# Altium footprint library con-samtec.PCBLIB: 805 footprints (part 26 of 55)
Each footprint in its own frame and in the unit in brackets; x right, y up, seen from the top. Pads: shape width x height; smd on the part's side, far side on the other; paste and mask are expansions set on the pad; w line width, h text height; cw(c..) or ccw(c..) is an arc to the next point about the centre after c.
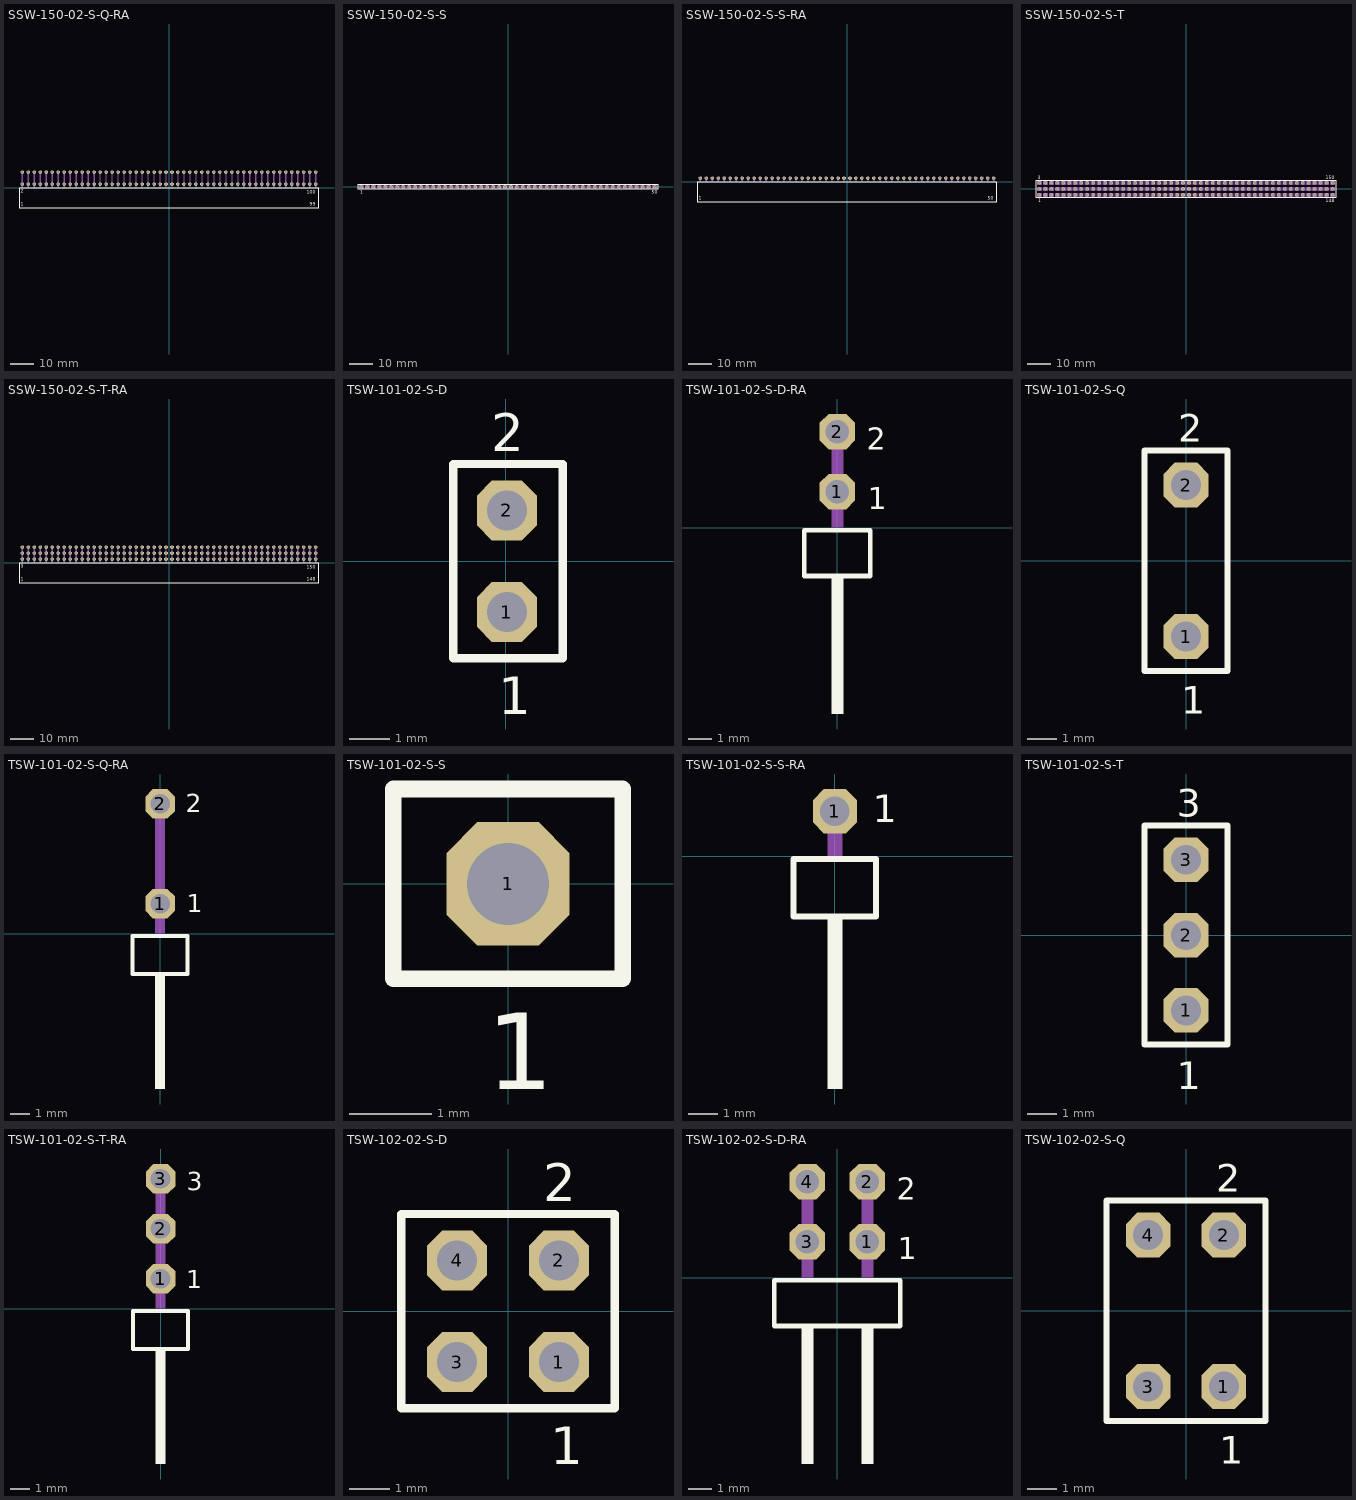
[diagram p25: the footprints below, top view; thin cyan lines are the x and y axes]

## SSW-150-02-S-Q-RA [mil]
pads (100):
  oct 59.06x59.06 hole 39.37: 1(-2450,60) 2(-2450,260) 3(-2350,60) 4(-2350,260) 5(-2250,60) 6(-2250,260) 7(-2150,60) 8(-2150,260) 9(-2050,60) 10(-2050,260) 11(-1950,60) 12(-1950,260) 13(-1850,60) 14(-1850,260) 15(-1750,60) 16(-1750,260) 17(-1650,60) 18(-1650,260) 19(-1550,60) 20(-1550,260) 21(-1450,60) 22(-1450,260) 23(-1350,60) 24(-1350,260) 25(-1250,60) 26(-1250,260) 27(-1150,60) 28(-1150,260) 29(-1050,60) 30(-1050,260) 31(-950,60) 32(-950,260) 33(-850,60) 34(-850,260) 35(-750,60) 36(-750,260) 37(-650,60) 38(-650,260) 39(-550,60) 40(-550,260) 41(-450,60) 42(-450,260) 43(-350,60) 44(-350,260) 45(-250,60) 46(-250,260) 47(-150,60) 48(-150,260) 49(-50,60) 50(-50,260) 51(50,60) 52(50,260) 53(150,60) 54(150,260) 55(250,60) 56(250,260) 57(350,60) 58(350,260) 59(450,60) 60(450,260) 61(550,60) 62(550,260) 63(650,60) 64(650,260) 65(750,60) 66(750,260) 67(850,60) 68(850,260) 69(950,60) 70(950,260) 71(1050,60) 72(1050,260) 73(1150,60) 74(1150,260) 75(1250,60) 76(1250,260) 77(1350,60) 78(1350,260) 79(1450,60) 80(1450,260) 81(1550,60) 82(1550,260) 83(1650,60) 84(1650,260) 85(1750,60) 86(1750,260) 87(1850,60) 88(1850,260) 89(1950,60) 90(1950,260) 91(2050,60) 92(2050,260) 93(2150,60) 94(2150,260) 95(2250,60) 96(2250,260) 97(2350,60) 98(2350,260) 99(2450,60) 100(2450,260)
Top Overlay:
  lines w8: -2505.08,-330.55 2505.08,-330.55 2505.08,-4.17 -2505.08,-4.17 -2505.08,-330.55
  text "1" at -2473.43,-301.18 h56.1
  text "100" at 2300,-100 h56.1
  text "99" at 2350,-300 h56.1
  text "2" at -2476.38,-86.61 h56.1
Mechanical 16:
  rectangle: -2460,0 -2440,270
  rectangle: -2360,0 -2340,270
  rectangle: -2260,0 -2240,270
  rectangle: -2160,0 -2140,270
  rectangle: -2060,0 -2040,270
  rectangle: -1960,0 -1940,270
  rectangle: -1860,0 -1840,270
  rectangle: -1760,0 -1740,270
  rectangle: -1660,0 -1640,270
  rectangle: -1560,0 -1540,270
  rectangle: -1460,0 -1440,270
  rectangle: -1360,0 -1340,270
  rectangle: -1260,0 -1240,270
  rectangle: -1160,0 -1140,270
  rectangle: -1060,0 -1040,270
  rectangle: -960,0 -940,270
  rectangle: -860,0 -840,270
  rectangle: -760,0 -740,270
  rectangle: -660,0 -640,270
  rectangle: -560,0 -540,270
  rectangle: -460,0 -440,270
  rectangle: -360,0 -340,270
  rectangle: -260,0 -240,270
  rectangle: -160,0 -140,270
  rectangle: -60,0 -40,270
  rectangle: 40,0 60,270
  rectangle: 140,0 160,270
  rectangle: 240,0 260,270
  rectangle: 340,0 360,270
  rectangle: 440,0 460,270
  rectangle: 540,0 560,270
  rectangle: 640,0 660,270
  rectangle: 740,0 760,270
  rectangle: 840,0 860,270
  rectangle: 940,0 960,270
  rectangle: 1040,0 1060,270
  rectangle: 1140,0 1160,270
  rectangle: 1240,0 1260,270
  rectangle: 1340,0 1360,270
  rectangle: 1440,0 1460,270
  rectangle: 1540,0 1560,270
  rectangle: 1640,0 1660,270
  rectangle: 1740,0 1760,270
  rectangle: 1840,0 1860,270
  rectangle: 1940,0 1960,270
  rectangle: 2040,0 2060,270
  rectangle: 2140,0 2160,270
  rectangle: 2240,0 2260,270
  rectangle: 2340,0 2360,270
  rectangle: 2440,0 2460,270

## SSW-150-02-S-S [mm]
pads (50):
  oct 1.5x1.5 hole 1: 1(-62.23,0) 2(-59.69,0) 3(-57.15,0) 4(-54.61,0) 5(-52.07,0) 6(-49.53,0) 7(-46.99,0) 8(-44.45,0) 9(-41.91,0) 10(-39.37,0) 11(-36.83,0) 12(-34.29,0) 13(-31.75,0) 14(-29.21,0) 15(-26.67,0) 16(-24.13,0) 17(-21.59,0) 18(-19.05,0) 19(-16.51,0) 20(-13.97,0) 21(-11.43,0) 22(-8.89,0) 23(-6.35,0) 24(-3.81,0) 25(-1.27,0) 26(1.27,0) 27(3.81,0) 28(6.35,0) 29(8.89,0) 30(11.43,0) 31(13.97,0) 32(16.51,0) 33(19.05,0) 34(21.59,0) 35(24.13,0) 36(26.67,0) 37(29.21,0) 38(31.75,0) 39(34.29,0) 40(36.83,0) 41(39.37,0) 42(41.91,0) 43(44.45,0) 44(46.99,0) 45(49.53,0) 46(52.07,0) 47(54.61,0) 48(57.15,0) 49(59.69,0) 50(62.23,0)
Top Overlay:
  lines w0.203: -63.629,-1.155 63.629,-1.155 63.629,1.155 -63.629,1.155 -63.629,-1.155
  text "1" at -62.738,-3.048 h1.42
  text "50" at 60.96,-3.048 h1.42
Mechanical 16:
  drawing of 200 lines, arcs and shapes, not listed

## SSW-150-02-S-S-RA [mil]
pads (50):
  oct 59.06x59.06 hole 39.37: 1(-2450,60) 2(-2350,60) 3(-2250,60) 4(-2150,60) 5(-2050,60) 6(-1950,60) 7(-1850,60) 8(-1750,60) 9(-1650,60) 10(-1550,60) 11(-1450,60) 12(-1350,60) 13(-1250,60) 14(-1150,60) 15(-1050,60) 16(-950,60) 17(-850,60) 18(-750,60) 19(-650,60) 20(-550,60) 21(-450,60) 22(-350,60) 23(-250,60) 24(-150,60) 25(-50,60) 26(50,60) 27(150,60) 28(250,60) 29(350,60) 30(450,60) 31(550,60) 32(650,60) 33(750,60) 34(850,60) 35(950,60) 36(1050,60) 37(1150,60) 38(1250,60) 39(1350,60) 40(1450,60) 41(1550,60) 42(1650,60) 43(1750,60) 44(1850,60) 45(1950,60) 46(2050,60) 47(2150,60) 48(2250,60) 49(2350,60) 50(2450,60)
Top Overlay:
  lines w8: -2505.08,-330.55 2505.08,-330.55 2505.08,-4.17 -2505.08,-4.17 -2505.08,-330.55
  text "1" at -2473.43,-301.18 h56.1
  text "50" at 2350,-300 h56.1
Mechanical 16:
  rectangle: -2460,0 -2440,70
  rectangle: -2360,0 -2340,70
  rectangle: -2260,0 -2240,70
  rectangle: -2160,0 -2140,70
  rectangle: -2060,0 -2040,70
  rectangle: -1960,0 -1940,70
  rectangle: -1860,0 -1840,70
  rectangle: -1760,0 -1740,70
  rectangle: -1660,0 -1640,70
  rectangle: -1560,0 -1540,70
  rectangle: -1460,0 -1440,70
  rectangle: -1360,0 -1340,70
  rectangle: -1260,0 -1240,70
  rectangle: -1160,0 -1140,70
  rectangle: -1060,0 -1040,70
  rectangle: -960,0 -940,70
  rectangle: -860,0 -840,70
  rectangle: -760,0 -740,70
  rectangle: -660,0 -640,70
  rectangle: -560,0 -540,70
  rectangle: -460,0 -440,70
  rectangle: -360,0 -340,70
  rectangle: -260,0 -240,70
  rectangle: -160,0 -140,70
  rectangle: -60,0 -40,70
  rectangle: 40,0 60,70
  rectangle: 140,0 160,70
  rectangle: 240,0 260,70
  rectangle: 340,0 360,70
  rectangle: 440,0 460,70
  rectangle: 540,0 560,70
  rectangle: 640,0 660,70
  rectangle: 740,0 760,70
  rectangle: 840,0 860,70
  rectangle: 940,0 960,70
  rectangle: 1040,0 1060,70
  rectangle: 1140,0 1160,70
  rectangle: 1240,0 1260,70
  rectangle: 1340,0 1360,70
  rectangle: 1440,0 1460,70
  rectangle: 1540,0 1560,70
  rectangle: 1640,0 1660,70
  rectangle: 1740,0 1760,70
  rectangle: 1840,0 1860,70
  rectangle: 1940,0 1960,70
  rectangle: 2040,0 2060,70
  rectangle: 2140,0 2160,70
  rectangle: 2240,0 2260,70
  rectangle: 2340,0 2360,70
  rectangle: 2440,0 2460,70

## SSW-150-02-S-T [mm]
pads (150):
  oct 1.5x1.5 hole 1: 1(-62.23,-2.54) 2(-62.23,0) 3(-62.23,2.54) 4(-59.69,-2.54) 5(-59.69,0) 6(-59.69,2.54) 7(-57.15,-2.54) 8(-57.15,0) 9(-57.15,2.54) 10(-54.61,-2.54) 11(-54.61,0) 12(-54.61,2.54) 13(-52.07,-2.54) 14(-52.07,0) 15(-52.07,2.54) 16(-49.53,-2.54) 17(-49.53,0) 18(-49.53,2.54) 19(-46.99,-2.54) 20(-46.99,0) 21(-46.99,2.54) 22(-44.45,-2.54) 23(-44.45,0) 24(-44.45,2.54) 25(-41.91,-2.54) 26(-41.91,0) 27(-41.91,2.54) 28(-39.37,-2.54) 29(-39.37,0) 30(-39.37,2.54) 31(-36.83,-2.54) 32(-36.83,0) 33(-36.83,2.54) 34(-34.29,-2.54) 35(-34.29,0) 36(-34.29,2.54) 37(-31.75,-2.54) 38(-31.75,0) 39(-31.75,2.54) 40(-29.21,-2.54) 41(-29.21,0) 42(-29.21,2.54) 43(-26.67,-2.54) 44(-26.67,0) 45(-26.67,2.54) 46(-24.13,-2.54) 47(-24.13,0) 48(-24.13,2.54) 49(-21.59,-2.54) 50(-21.59,0) 51(-21.59,2.54) 52(-19.05,-2.54) 53(-19.05,0) 54(-19.05,2.54) 55(-16.51,-2.54) 56(-16.51,0) 57(-16.51,2.54) 58(-13.97,-2.54) 59(-13.97,0) 60(-13.97,2.54) 61(-11.43,-2.54) 62(-11.43,0) 63(-11.43,2.54) 64(-8.89,-2.54) 65(-8.89,0) 66(-8.89,2.54) 67(-6.35,-2.54) 68(-6.35,0) 69(-6.35,2.54) 70(-3.81,-2.54) 71(-3.81,0) 72(-3.81,2.54) 73(-1.27,-2.54) 74(-1.27,0) 75(-1.27,2.54) 76(1.27,-2.54) 77(1.27,0) 78(1.27,2.54) 79(3.81,-2.54) 80(3.81,0) 81(3.81,2.54) 82(6.35,-2.54) 83(6.35,0) 84(6.35,2.54) 85(8.89,-2.54) 86(8.89,0) 87(8.89,2.54) 88(11.43,-2.54) 89(11.43,0) 90(11.43,2.54) 91(13.97,-2.54) 92(13.97,0) 93(13.97,2.54) 94(16.51,-2.54) 95(16.51,0) 96(16.51,2.54) 97(19.05,-2.54) 98(19.05,0) 99(19.05,2.54) 100(21.59,-2.54) 101(21.59,0) 102(21.59,2.54) 103(24.13,-2.54) 104(24.13,0) 105(24.13,2.54) 106(26.67,-2.54) 107(26.67,0) 108(26.67,2.54) 109(29.21,-2.54) 110(29.21,0) 111(29.21,2.54) 112(31.75,-2.54) 113(31.75,0) 114(31.75,2.54) 115(34.29,-2.54) 116(34.29,0) 117(34.29,2.54) 118(36.83,-2.54) 119(36.83,0) 120(36.83,2.54) 121(39.37,-2.54) 122(39.37,0) 123(39.37,2.54) 124(41.91,-2.54) 125(41.91,0) 126(41.91,2.54) 127(44.45,-2.54) 128(44.45,0) 129(44.45,2.54) 130(46.99,-2.54) 131(46.99,0) 132(46.99,2.54) 133(49.53,-2.54) 134(49.53,0) 135(49.53,2.54) 136(52.07,-2.54) 137(52.07,0) 138(52.07,2.54) 139(54.61,-2.54) 140(54.61,0) 141(54.61,2.54) 142(57.15,-2.54) 143(57.15,0) 144(57.15,2.54) 145(59.69,-2.54) 146(59.69,0) 147(59.69,2.54) 148(62.23,-2.54) 149(62.23,0) 150(62.23,2.54)
Top Overlay:
  lines w0.203: -63.629,-3.695 63.629,-3.695 63.629,3.695 -63.629,3.695 -63.629,-3.695
  text "1" at -62.738,-5.588 h1.42
  text "3" at -62.992,4.064 h1.42
  text "148" at 59.182,-5.588 h1.42
  text "150" at 59.182,4.064 h1.42
Mechanical 16:
  drawing of 600 lines, arcs and shapes, not listed

## SSW-150-02-S-T-RA [mil]
pads (150):
  oct 59.06x59.06 hole 39.37: 1(-2450,60) 2(-2450,160) 3(-2450,260) 4(-2350,60) 5(-2350,160) 6(-2350,260) 7(-2250,60) 8(-2250,160) 9(-2250,260) 10(-2150,60) 11(-2150,160) 12(-2150,260) 13(-2050,60) 14(-2050,160) 15(-2050,260) 16(-1950,60) 17(-1950,160) 18(-1950,260) 19(-1850,60) 20(-1850,160) 21(-1850,260) 22(-1750,60) 23(-1750,160) 24(-1750,260) 25(-1650,60) 26(-1650,160) 27(-1650,260) 28(-1550,60) 29(-1550,160) 30(-1550,260) 31(-1450,60) 32(-1450,160) 33(-1450,260) 34(-1350,60) 35(-1350,160) 36(-1350,260) 37(-1250,60) 38(-1250,160) 39(-1250,260) 40(-1150,60) 41(-1150,160) 42(-1150,260) 43(-1050,60) 44(-1050,160) 45(-1050,260) 46(-950,60) 47(-950,160) 48(-950,260) 49(-850,60) 50(-850,160) 51(-850,260) 52(-750,60) 53(-750,160) 54(-750,260) 55(-650,60) 56(-650,160) 57(-650,260) 58(-550,60) 59(-550,160) 60(-550,260) 61(-450,60) 62(-450,160) 63(-450,260) 64(-350,60) 65(-350,160) 66(-350,260) 67(-250,60) 68(-250,160) 69(-250,260) 70(-150,60) 71(-150,160) 72(-150,260) 73(-50,60) 74(-50,160) 75(-50,260) 76(50,60) 77(50,160) 78(50,260) 79(150,60) 80(150,160) 81(150,260) 82(250,60) 83(250,160) 84(250,260) 85(350,60) 86(350,160) 87(350,260) 88(450,60) 89(450,160) 90(450,260) 91(550,60) 92(550,160) 93(550,260) 94(650,60) 95(650,160) 96(650,260) 97(750,60) 98(750,160) 99(750,260) 100(850,60) 101(850,160) 102(850,260) 103(950,60) 104(950,160) 105(950,260) 106(1050,60) 107(1050,160) 108(1050,260) 109(1150,60) 110(1150,160) 111(1150,260) 112(1250,60) 113(1250,160) 114(1250,260) 115(1350,60) 116(1350,160) 117(1350,260) 118(1450,60) 119(1450,160) 120(1450,260) 121(1550,60) 122(1550,160) 123(1550,260) 124(1650,60) 125(1650,160) 126(1650,260) 127(1750,60) 128(1750,160) 129(1750,260) 130(1850,60) 131(1850,160) 132(1850,260) 133(1950,60) 134(1950,160) 135(1950,260) 136(2050,60) 137(2050,160) 138(2050,260) 139(2150,60) 140(2150,160) 141(2150,260) 142(2250,60) 143(2250,160) 144(2250,260) 145(2350,60) 146(2350,160) 147(2350,260) 148(2450,60) 149(2450,160) 150(2450,260)
Top Overlay:
  lines w8: -2505.08,-330.55 2505.08,-330.55 2505.08,-4.17 -2505.08,-4.17 -2505.08,-330.55
  text "1" at -2473.43,-301.18 h56.1
  text "150" at 2300,-100 h56.1
  text "148" at 2300,-300 h56.1
  text "3" at -2476.38,-86.61 h56.1
Mechanical 16:
  rectangle: -2460,0 -2440,270
  rectangle: -2360,0 -2340,270
  rectangle: -2260,0 -2240,270
  rectangle: -2160,0 -2140,270
  rectangle: -2060,0 -2040,270
  rectangle: -1960,0 -1940,270
  rectangle: -1860,0 -1840,270
  rectangle: -1760,0 -1740,270
  rectangle: -1660,0 -1640,270
  rectangle: -1560,0 -1540,270
  rectangle: -1460,0 -1440,270
  rectangle: -1360,0 -1340,270
  rectangle: -1260,0 -1240,270
  rectangle: -1160,0 -1140,270
  rectangle: -1060,0 -1040,270
  rectangle: -960,0 -940,270
  rectangle: -860,0 -840,270
  rectangle: -760,0 -740,270
  rectangle: -660,0 -640,270
  rectangle: -560,0 -540,270
  rectangle: -460,0 -440,270
  rectangle: -360,0 -340,270
  rectangle: -260,0 -240,270
  rectangle: -160,0 -140,270
  rectangle: -60,0 -40,270
  rectangle: 40,0 60,270
  rectangle: 140,0 160,270
  rectangle: 240,0 260,270
  rectangle: 340,0 360,270
  rectangle: 440,0 460,270
  rectangle: 540,0 560,270
  rectangle: 640,0 660,270
  rectangle: 740,0 760,270
  rectangle: 840,0 860,270
  rectangle: 940,0 960,270
  rectangle: 1040,0 1060,270
  rectangle: 1140,0 1160,270
  rectangle: 1240,0 1260,270
  rectangle: 1340,0 1360,270
  rectangle: 1440,0 1460,270
  rectangle: 1540,0 1560,270
  rectangle: 1640,0 1660,270
  rectangle: 1740,0 1760,270
  rectangle: 1840,0 1860,270
  rectangle: 1940,0 1960,270
  rectangle: 2040,0 2060,270
  rectangle: 2140,0 2160,270
  rectangle: 2240,0 2260,270
  rectangle: 2340,0 2360,270
  rectangle: 2440,0 2460,270

## TSW-101-02-S-D [mm]
pads (2):
  oct 1.5x1.5 hole 1: 1(0.02,-1.27) 2(0.02,1.27)
Top Overlay:
  lines w0.203: -1.319,-2.425 1.419,-2.425 1.419,2.425 -1.319,2.425 -1.319,-2.425
  text "1" at -0.188,-3.818 h0.94
  text "2" at -0.363,2.744 h0.94
Mechanical 16:
  rectangle: -0.33,-1.62 0.37,-0.92
  rectangle: -0.33,0.92 0.37,1.62

## TSW-101-02-S-D-RA [mil]
pads (2):
  oct 59.06x59.06 hole 39.37: 1(0,60) 2(0,160)
Top Overlay:
  rectangle: -10,-310.63 10,-80.32
  lines w8: -55.08,-80.55 55.08,-80.55 55.08,-4.17 -55.08,-4.17 -55.08,-80.55
  text "1" at 50.59,30.51 h36.81
  text "2" at 49.21,129.53 h36.81
Mechanical 16:
  rectangle: -10,0 10,170

## TSW-101-02-S-Q [mm]
pads (2):
  oct 1.5x1.5 hole 1: 1(0,-2.54) 2(0,2.54)
Top Overlay:
  lines w0.203: -1.399,-3.695 1.399,-3.695 1.399,3.695 -1.399,3.695 -1.399,-3.695
  text "1" at -0.158,-5.138 h0.94
  text "2" at -0.258,3.989 h0.94
Mechanical 16:
  rectangle: -0.35,-2.89 0.35,-2.19
  rectangle: -0.35,2.19 0.35,2.89

## TSW-101-02-S-Q-RA [mil]
pads (2):
  oct 59.06x59.06 hole 39.37: 1(0,60) 2(0,260)
Top Overlay:
  rectangle: -10,-310.63 10,-80.32
  lines w8: -55.08,-80.55 55.08,-80.55 55.08,-4.17 -55.08,-4.17 -55.08,-80.55
  text "1" at 53.54,43.31 h36.81
  text "2" at 51.18,242.72 h36.81
Mechanical 16:
  rectangle: -10,0 10,270

## TSW-101-02-S-S [mm]
pads (1):
  oct 1.5x1.5 hole 1: 1(0,0)
Top Overlay:
  lines w0.203: -1.399,-1.155 1.399,-1.155 1.399,1.155 -1.399,1.155 -1.399,-1.155
  text "1" at -0.258,-2.498 h0.94
Mechanical 16:
  rectangle: -0.35,-0.35 0.35,0.35

## TSW-101-02-S-S-RA [mil]
pads (1):
  oct 59.06x59.06 hole 39.37: 1(0,60)
Top Overlay:
  rectangle: -10,-310.63 10,-80.32
  lines w8: -55.08,-80.55 55.08,-80.55 55.08,-4.17 -55.08,-4.17 -55.08,-80.55
  text "1" at 50.47,45.35 h36.81
Mechanical 16:
  rectangle: -10,0 10,70

## TSW-101-02-S-T [mm]
pads (3):
  oct 1.5x1.5 hole 1: 1(0,-2.54) 2(0,0) 3(0,2.54)
Top Overlay:
  lines w0.203: -1.399,-3.695 1.399,-3.695 1.399,3.695 -1.399,3.695 -1.399,-3.695
  text "1" at -0.308,-5.188 h0.94
  text "3" at -0.312,3.989 h0.94
Mechanical 16:
  rectangle: -0.35,-2.89 0.35,-2.19
  rectangle: -0.35,-0.35 0.35,0.35
  rectangle: -0.35,2.19 0.35,2.89

## TSW-101-02-S-T-RA [mil]
pads (3):
  oct 59.06x59.06 hole 39.37: 1(0,60) 2(0,160) 3(0,260)
Top Overlay:
  rectangle: -10,-310.63 10,-80.32
  lines w8: -55.08,-80.55 55.08,-80.55 55.08,-4.17 -55.08,-4.17 -55.08,-80.55
  text "1" at 51.57,41.34 h36.81
  text "3" at 52.17,236.81 h36.81
Mechanical 16:
  rectangle: -10,0 10,270

## TSW-102-02-S-D [mm]
pads (4):
  oct 1.5x1.5 hole 1: 1(1.27,-1.27) 2(1.27,1.27) 3(-1.27,-1.27) 4(-1.27,1.27)
Top Overlay:
  lines w0.203: -2.669,-2.425 2.669,-2.425 2.669,2.425 -2.669,2.425 -2.669,-2.425
  text "1" at 1.062,-3.818 h0.94
  text "2" at 0.887,2.744 h0.94
Mechanical 16:
  rectangle: -1.62,-1.62 -0.92,-0.92
  rectangle: -1.62,0.92 -0.92,1.62
  rectangle: 0.92,-1.62 1.62,-0.92
  rectangle: 0.92,0.92 1.62,1.62

## TSW-102-02-S-D-RA [mil]
pads (4):
  oct 59.06x59.06 hole 39.37: 1(50,60) 2(50,160) 3(-50,60) 4(-50,160)
Top Overlay:
  rectangle: -60,-310.63 -40,-80.32
  rectangle: 40,-310.63 60,-80.32
  lines w8: -105.08,-80.55 105.08,-80.55 105.08,-4.17 -105.08,-4.17 -105.08,-80.55
  text "1" at 100.59,30.51 h36.81
  text "2" at 99.21,129.53 h36.81
Mechanical 16:
  rectangle: -60,0 -40,170
  rectangle: 40,0 60,170

## TSW-102-02-S-Q [mm]
pads (4):
  oct 1.5x1.5 hole 1: 1(1.27,-2.54) 2(1.27,2.54) 3(-1.27,-2.54) 4(-1.27,2.54)
Top Overlay:
  lines w0.203: -2.669,-3.695 2.669,-3.695 2.669,3.695 -2.669,3.695 -2.669,-3.695
  text "1" at 1.112,-5.138 h0.94
  text "2" at 1.012,3.989 h0.94
Mechanical 16:
  rectangle: -1.62,-2.89 -0.92,-2.19
  rectangle: -1.62,2.19 -0.92,2.89
  rectangle: 0.92,-2.89 1.62,-2.19
  rectangle: 0.92,2.19 1.62,2.89